# Altium footprint library BaseBoard.PcbLib: 128 footprints (part 7 of 8)
Each footprint in its own frame and in the unit in brackets; x right, y up, seen from the top. Pads: shape width x height; smd on the part's side, far side on the other; paste and mask are expansions set on the pad; w line width, h text height; cw(c..) or ccw(c..) is an arc to the next point about the centre after c.
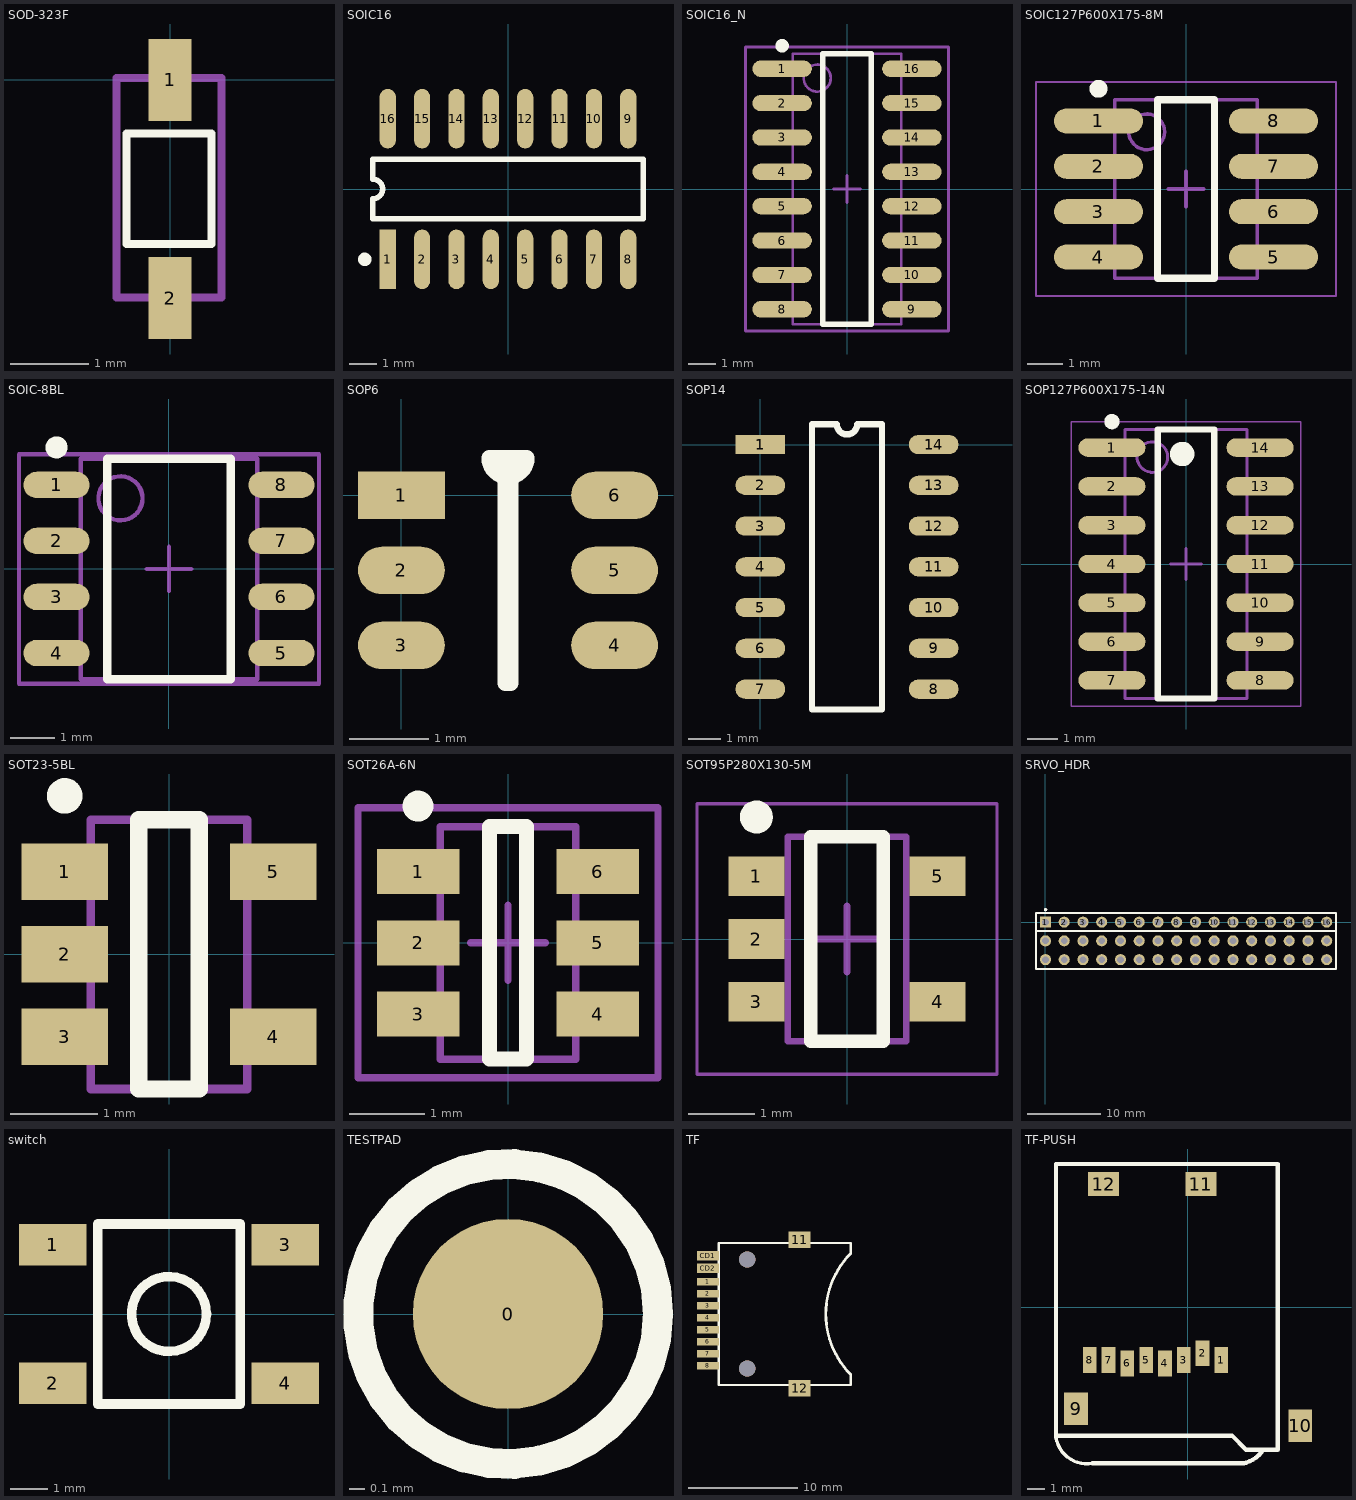
[diagram p6: the footprints below, top view; thin cyan lines are the x and y axes]

## SOD-323F [mm]
pads (2):
  rect 0.55x1.05 smd: 1(0,0) 2(0,-2.8)
Top Overlay:
  lines w0.102: -0.559,-2.108 0.533,-2.108 0.533,-0.686 -0.559,-0.686 -0.559,-2.108
Mechanical 13:
  lines w0.102: -0.69,-2.794 -0.69,0.025 0.66,0.025 0.66,-2.794 -0.69,-2.794
3D body: height 1, standoff 0, extent -0.686,-2.794 0.66,0.025

## SOIC16 [mm]
pads (16):
  rect 0.6x2.2 smd: 1(-4.445,-2.6)
  oval 0.6x2.2 smd: 2(-3.175,-2.6) 3(-1.905,-2.6) 4(-0.635,-2.6) 5(0.635,-2.6) 6(1.905,-2.6) 7(3.175,-2.6) 8(4.445,-2.6) 9(4.445,2.6) 10(3.175,2.6) 11(1.905,2.6) 12(0.635,2.6) 13(-0.635,2.6) 14(-1.905,2.6) 15(-3.175,2.6) 16(-4.445,2.6)
Top Overlay:
  circle w0.25: c-5.295,-2.6 r0.125
  lines w0.2: -5,-1.1 -5,-0.367 ccw(c-5,0) -5,0.367 -5,1.1 5,1.1 5,-1.1 -5,-1.1

## SOIC16_N [mm] "SOIC, 16-Leads, Body 9.9x3.9mm, Pitch 1.27mm, IPC Medium Density"
height 1.91
pads (16):
  oval 2.2x0.6 smd: 1(-2.4,4.445) 2(-2.4,3.175) 3(-2.4,1.905) 4(-2.4,0.635) 5(-2.4,-0.635) 6(-2.4,-1.905) 7(-2.4,-3.175) 8(-2.4,-4.445) 9(2.4,-4.445) 10(2.4,-3.175) 11(2.4,-1.905) 12(2.4,-0.635) 13(2.4,0.635) 14(2.4,1.905) 15(2.4,3.175) 16(2.4,4.445)
Top Overlay:
  circle w0.25: c-2.4,5.295 r0.125
  lines w0.2: -0.9,-5 0.9,-5 0.9,5 -0.9,5 -0.9,-5
Mechanical 13:
  circle w0.1: c-1.1,4.1 r0.5
  lines w0.1: -2,-5 2,-5 2,5 -2,5 -2,-5
Mechanical 15:
  lines w0.1: -0.5,0 0.5,0 ; 0,-0.5 0,0.5 ; -3.75,-5.25 3.75,-5.25 3.75,5.25 -3.75,5.25 -3.75,-5.25
3D body: height 1.91, standoff 0, extent -2,-5 2,5

## SOIC127P600X175-8M [mm] "SOIC, 8-Leads, Body 4.90x3.90mm, Pitch 1.27mm, IPC Low Density"
height 1.75
pads (8):
  oval 2.5x0.7 smd: 1(-2.45,1.905) 2(-2.45,0.635) 3(-2.45,-0.635) 4(-2.45,-1.905) 5(2.45,-1.905) 6(2.45,-0.635) 7(2.45,0.635) 8(2.45,1.905)
Top Overlay:
  circle w0.25: c-2.45,2.805 r0.125
  lines w0.2: -0.8,-2.5 0.8,-2.5 0.8,2.5 -0.8,2.5 -0.8,-2.5
Mechanical 13:
  circle w0.1: c-1.1,1.6 r0.5
  lines w0.1: -2,-2.5 2,-2.5 2,2.5 -2,2.5 -2,-2.5
Mechanical 15:
  lines w0.05: -4.2,-3 4.2,-3 4.2,3 -4.2,3 -4.2,-3
  lines w0.1: -0.5,0 0.5,0 ; 0,-0.5 0,0.5
3D body: height 1.75, standoff 0.1, extent -2,-2.5 2,2.5

## SOIC-8BL [mm] "SOIC, 8-Leads, Body 4.9x3.9mm, Pitch 1.27mm, IPC High Density"
height 2.59
pads (8):
  oval 1.5x0.6 smd: 1(-2.55,1.905) 2(-2.55,0.635) 3(-2.55,-0.635) 4(-2.55,-1.905) 5(2.55,-1.905) 6(2.55,-0.635) 7(2.55,0.635) 8(2.55,1.905)
Top Overlay:
  circle w0.25: c-2.55,2.755 r0.125
  lines w0.2: -1.4,-2.5 1.4,-2.5 1.4,2.5 -1.4,2.5 -1.4,-2.5
Mechanical 13:
  circle w0.1: c-1.1,1.6 r0.5
  lines w0.1: -2,-2.5 2,-2.5 2,2.5 -2,2.5 -2,-2.5
Mechanical 15:
  lines w0.1: -0.5,0 0.5,0 ; 0,-0.5 0,0.5 ; -3.4,-2.6 3.4,-2.6 3.4,2.6 -3.4,2.6 -3.4,-2.6
3D body: height 2.59, standoff 0, extent -2,-2.5 2,2.5

## SOP6 [mm]
pads (6):
  rect 1.1x0.6 smd: 1(0,0)
  oval 1.1x0.6 smd: 2(0,-0.95) 3(0,-1.9) 4(2.7,-1.9) 5(2.7,-0.95) 6(2.7,0)
Top Overlay:
  lines w0.2: 1.112,0.475 ccw(c1.35,0.475) 1.587,0.475 1.315,0.475 1.315,-2.375 1.385,-2.375 1.385,0.475 1.112,0.475

## SOP14 [mm]
pads (14):
  rect 1.55x0.6 smd: 1(0,0)
  oval 1.55x0.6 smd: 2(0,-1.27) 3(0,-2.54) 4(0,-3.81) 5(0,-5.08) 6(0,-6.35) 7(0,-7.62) 8(5.4,-7.62) 9(5.4,-6.35) 10(5.4,-5.08) 11(5.4,-3.81) 12(5.4,-2.54) 13(5.4,-1.27) 14(5.4,0)
Top Overlay:
  lines w0.2: 1.61,-8.255 1.61,0.635 2.382,0.635 ccw(c2.7,0.635) 3.017,0.635 3.79,0.635 3.79,-8.255 1.61,-8.255

## SOP127P600X175-14N [mm] "SOP, 14-Leads, Body 8.65x3.90mm, Pitch 1.27mm, IPC Medium Density"
height 1.75
pads (14):
  oval 2.2x0.6 smd: 1(-2.425,3.81) 2(-2.425,2.54) 3(-2.425,1.27) 4(-2.425,0) 5(-2.425,-1.27) 6(-2.425,-2.54) 7(-2.425,-3.81) 8(2.425,-3.81) 9(2.425,-2.54) 10(2.425,-1.27) 11(2.425,0) 12(2.425,1.27) 13(2.425,2.54) 14(2.425,3.81)
Top Overlay:
  circle w0.25: c-2.425,4.66 r0.125
  circle w0.4: c-0.125,3.6 r0.2
  lines w0.2: -0.925,-4.4 -0.925,4.4 0.925,4.4 0.925,-4.4 -0.925,-4.4
Mechanical 13:
  circle w0.1: c-1.1,3.5 r0.5
  lines w0.1: -2,-4.4 -2,4.4 2,4.4 2,-4.4 -2,-4.4
Mechanical 15:
  lines w0.05: -3.75,-4.65 -3.75,4.65 3.75,4.65 3.75,-4.65 -3.75,-4.65
  lines w0.1: -0.5,0 0.5,0 ; 0,-0.5 0,0.5
3D body: height 1.75, standoff 0.1, extent -2,-4.4 2,4.4

## SOT23-5BL [mm] "SOT23, 5-Leads, Body 2.9x1.6mm, Pitch 0.95mm, Lead Span 2.8mm, IPC High Density"
height 1.19
pads (5):
  rect 1x0.65 smd: 1(-1.2,0.95) 2(-1.2,0) 3(-1.2,-0.95) 4(1.2,-0.95) 5(1.2,0.95)
Top Overlay:
  circle w0.25: c-1.2,1.825 r0.08
  lines w0.2: -0.35,-1.55 0.35,-1.55 0.35,1.55 -0.35,1.55 -0.35,-1.55
Mechanical 13:
  lines w0.1: -0.9,-1.55 -0.9,1.55 0.9,1.55 0.9,-1.55 -0.9,-1.55
3D body: height 1.19, standoff 0, extent -0.9,-1.55 0.9,1.55

## SOT26A-6N [mm] "SOT23, 6-Leads, Body 2.9x1.7mm, Pitch 0.95mm, Lead Span 2.8mm, IPC Medium Density"
height 1.45
pads (6):
  rect 1.1x0.6 smd: 1(-1.2,0.95) 2(-1.2,0) 3(-1.2,-0.95) 4(1.2,-0.95) 5(1.2,0) 6(1.2,0.95)
Top Overlay:
  circle w0.25: c-1.2,1.825 r0.08
  lines w0.2: -0.25,-1.55 -0.25,1.55 0.25,1.55 0.25,-1.55 -0.25,-1.55
Mechanical 13:
  lines w0.1: -0.9,-1.55 0.9,-1.55 0.9,1.55 -0.9,1.55 -0.9,-1.55
Mechanical 15:
  lines w0.1: -0.5,0 0.5,0 ; 0,-0.5 0,0.5 ; -2,-1.8 2,-1.8 2,1.8 -2,1.8 -2,-1.8
3D body: height 1.45, standoff 0, extent -0.9,-1.55 0.9,1.55

## SOT95P280X130-5M [mm] "SOT23, 5-Leads, Body 2.90x2.80mm, Pitch 0.95mm, IPC Low Density"
height 1.3
pads (5):
  rect 0.85x0.6 smd: 1(-1.375,0.95) 2(-1.375,0) 3(-1.375,-0.95) 4(1.375,-0.95) 5(1.375,0.95)
Top Overlay:
  circle w0.25: c-1.375,1.85 r0.125
  lines w0.2: -0.55,-1.55 0.55,-1.55 0.55,1.55 -0.55,1.55 -0.55,-1.55
Mechanical 13:
  lines w0.1: -0.9,-1.55 -0.9,1.55 0.9,1.55 0.9,-1.55 -0.9,-1.55
Mechanical 15:
  lines w0.05: -2.275,-2.05 -2.275,2.05 2.275,2.05 2.275,-2.05 -2.275,-2.05
  lines w0.1: -0.5,0 0.5,0 ; 0,-0.5 0,0.5
3D body: height 1.3, standoff 0.2, extent -0.9,-1.55 0.9,1.55

## SRVO_HDR [mm] "16 channel PWM servo header"
pads (48):
  rect 1.5x1.5 hole 0.9: 1(0,0)
  round 1.5 hole 0.9: 2(2.54,0) 3(5.08,0) 4(7.62,0) 5(10.16,0) 6(12.7,0) 7(15.24,0) 8(17.78,0) 9(20.32,0) 10(22.86,0) 11(25.4,0) 12(27.94,0) 13(30.48,0) 14(33.02,0) 15(35.56,0) 16(38.1,0) GND(0,-5.08) GND(2.54,-5.08) GND(5.08,-5.08) GND(7.62,-5.08) GND(10.16,-5.08) GND(12.7,-5.08) GND(15.24,-5.08) GND(17.78,-5.08) GND(20.32,-5.08) GND(22.86,-5.08) GND(25.4,-5.08) GND(27.94,-5.08) GND(30.48,-5.08) GND(33.02,-5.08) GND(35.56,-5.08) GND(38.1,-5.08) PWR(0,-2.54) PWR(2.54,-2.54) PWR(5.08,-2.54) PWR(7.62,-2.54) PWR(10.16,-2.54) PWR(12.7,-2.54) PWR(15.24,-2.54) PWR(17.78,-2.54) PWR(20.32,-2.54) PWR(22.86,-2.54) PWR(25.4,-2.54) PWR(27.94,-2.54) PWR(30.48,-2.54) PWR(33.02,-2.54) PWR(35.56,-2.54) PWR(38.1,-2.54)
Top Overlay:
  circle w0.254: c0.012,1.7 r0.103
  lines w0.254: -1.285,-1.225 -1.285,-6.375 39.355,-6.375 39.355,-1.225 ; -1.285,-1.225 39.355,-1.225 ; -1.285,-1.225 -1.285,1.235 39.355,1.235 39.355,-1.225
3D body "Samtec-TSW-116-08-G-T-RA.step": height 8.31, standoff -2.1, extent -1.24,-14.952 39.4,0.352

## switch [mm]
pads (4):
  rect 1.8x1.1 smd: 1(-3.1,1.85) 2(-3.1,-1.85) 3(3.1,1.85) 4(3.1,-1.85)
Top Overlay:
  circle w0.254: c0,0 r1
  lines w0.254: -1.905,-2.4 -1.905,2.4 1.905,2.4 1.905,-2.4 -1.905,-2.4

## TESTPAD [mm]
pads (1):
  round 1.27 smd: 0(0,0)
Top Overlay:
  circle w0.2: c0,0 r1

## TF [mm]
pads (14):
  rect 2x0.7 smd: 1(96.301,-121.69) 2(96.301,-122.791) 3(96.301,-123.89) 4(96.301,-124.991) 5(96.301,-126.09) 6(96.301,-127.191) 7(96.301,-128.29) 8(96.301,-129.39)
  rect 2x1.5 smd: 11(104.701,-117.82) 12(104.701,-131.46)
  rect 2x0.85 smd: CD1(96.301,-119.29) CD2(96.301,-120.441)
  round 1.5 hole 1.5 unplated: ""(99.901,-129.64)
  round 1.5 hole 1.5: ""(99.901,-119.641)
Top Overlay:
  lines w0.2: 109.401,-130.19 109.401,-131.155 97.301,-131.155 97.301,-118.125 109.401,-118.125 109.401,-119.09
  lines w0.254: 109.401,-130.19 cw(c114.951,-124.64) 109.401,-119.09

## TF-PUSH [mm]
pads (12):
  rect 0.8x1.5 smd: 1(1.95,-3.1) 2(0.85,-2.7) 3(-0.25,-3.1) 4(-1.35,-3.3) 5(-2.45,-3.1) 6(-3.55,-3.3) 7(-4.65,-3.1) 8(-5.75,-3.1)
  rect 1.4x1.9 smd: 9(-6.55,-5.95) 10(6.57,-6.95)
  rect 1.8x1.4 smd: 11(0.76,7.2) 12(-4.94,7.2)
Top Overlay:
  lines w0.2: -7.725,-7.65 ccw(c-5.907,-7.332) -5.59,-9.15
  lines w0.254: -7.725,-7.65 -7.725,-5.225 -7.725,8.375 5.25,8.375 5.25,-8.35 3.4,-8.35 2.575,-7.525 0.62,-7.525 -7.65,-7.525 ; -5.59,-9.15 3.3,-9.15 ; 3.193,-9.158 ccw(c2.881,-7.385) 4.406,-8.341